# Altium footprint library PcbLib1.PcbLib: 148 footprints (part 9 of 10)
Each footprint in its own frame and in the unit in brackets; x right, y up, seen from the top. Pads: shape width x height; smd on the part's side, far side on the other; paste and mask are expansions set on the pad; w line width, h text height; cw(c..) or ccw(c..) is an arc to the next point about the centre after c.
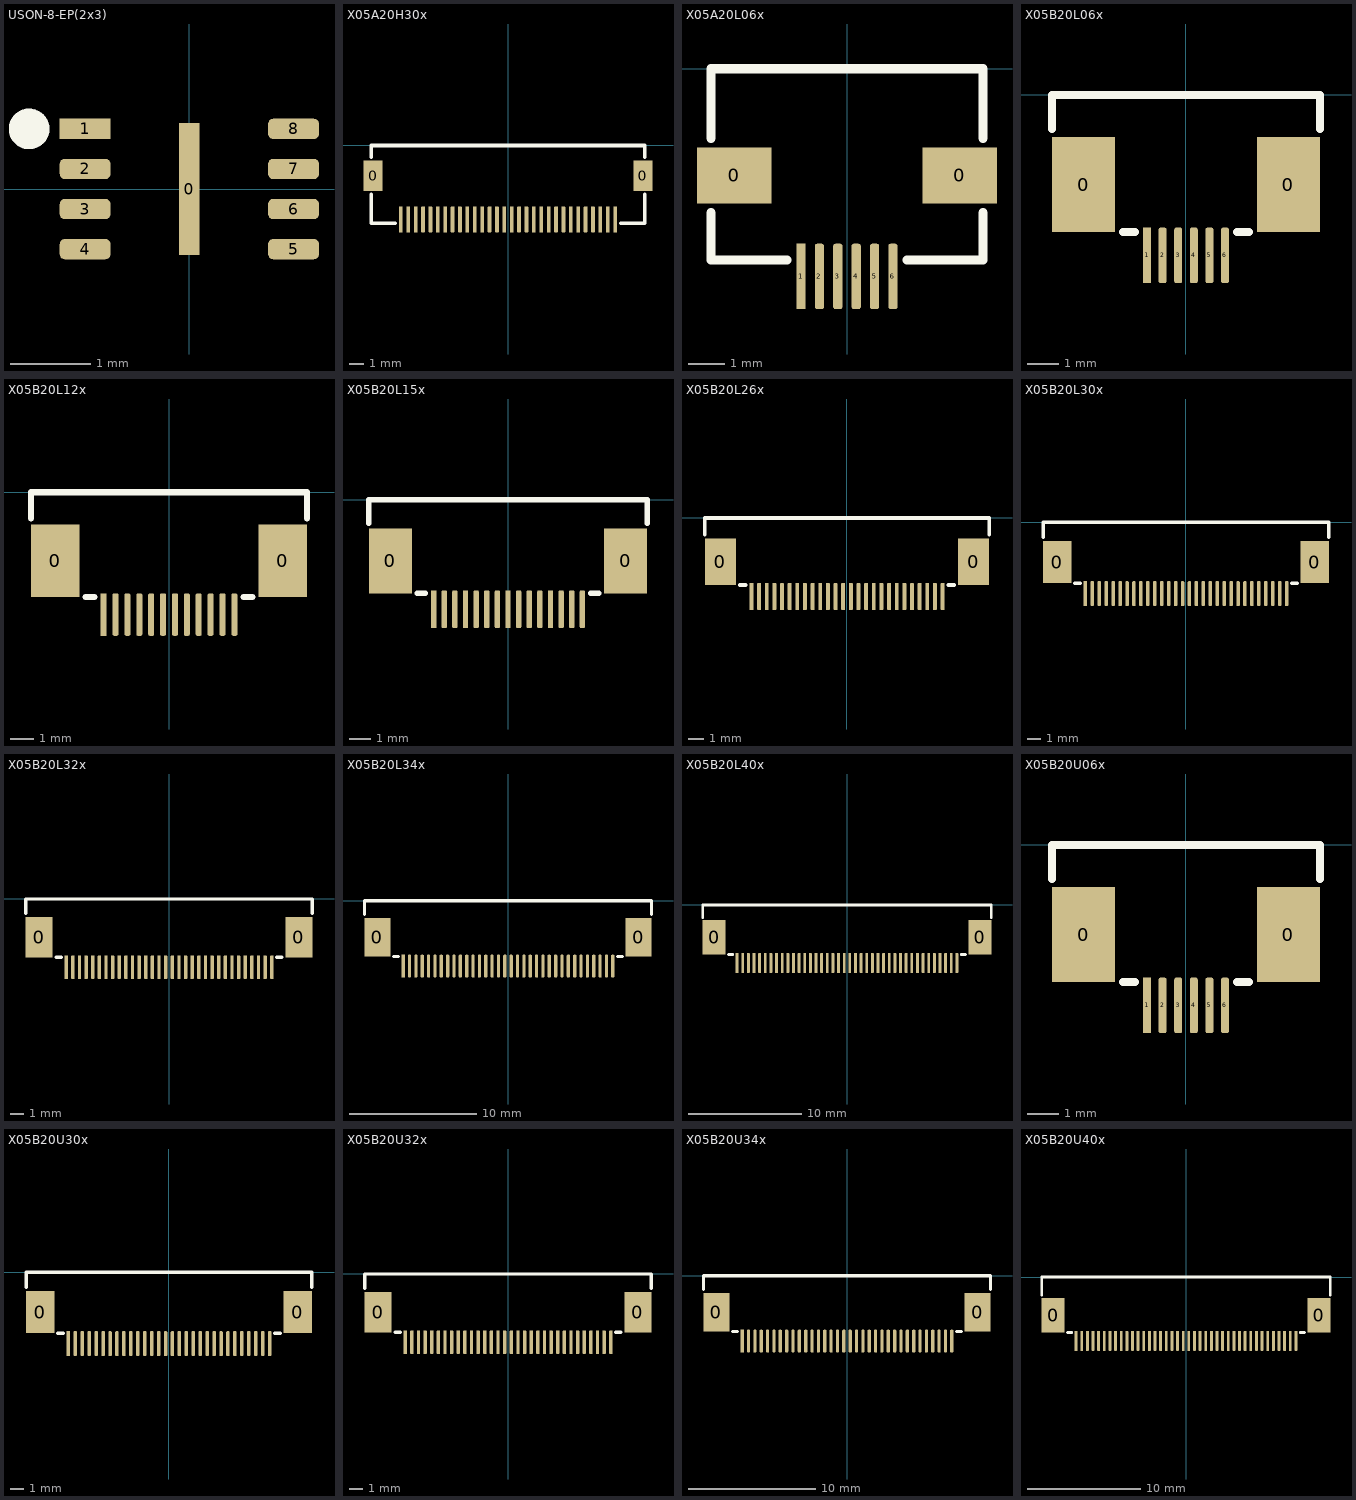
[diagram p8: the footprints below, top view; thin cyan lines are the x and y axes]

## USON-8-EP(2x3) [mm]
pads (9):
  rect 0.254x1.651 smd: 0(0,0)
  rect 0.635x0.254 smd: 1(-1.3,0.75)
  rrect50% 0.635x0.254 smd: 2(-1.3,0.25) 3(-1.3,-0.25) 4(-1.3,-0.75) 5(1.3,-0.75) 6(1.3,-0.25) 7(1.3,0.25) 8(1.3,0.75)
Top Overlay:
  circle w0.254: c-1.998,0.75 r0.127
3D body "USON-8-EP(2x3).step": height 0.51, standoff 0, extent -1.549,-1.054 1.549,1.054

## X05A20H30x [mil] "XKB，0.5mm(H=2.0mm)，30P，翻盖式，双侧触点/上下接，T:镀锡 G:镀锡"
pads (32):
  rect 50x80 smd: 0(-359.61,-80.71) 0(359.61,-80.71)
  rect 10x70 smd: 1(-285.43,-197.09)
  rrect50% 10x70 smd: 2(-265.75,-197.09) 3(-246.06,-197.09) 4(-226.38,-197.09) 5(-206.69,-197.09) 6(-187.01,-197.09) 7(-167.32,-197.09) 8(-147.64,-197.09) 9(-127.95,-197.09) 10(-108.27,-197.09) 11(-88.58,-197.09) 12(-68.9,-197.09) 13(-49.21,-197.09) 14(-29.53,-197.09) 15(-9.84,-197.09) 16(9.84,-197.09) 17(29.53,-197.09) 18(49.21,-197.09) 19(68.9,-197.09) 20(88.58,-197.09) 21(108.27,-197.09) 22(127.95,-197.09) 23(147.64,-197.09) 24(167.32,-197.09) 25(187.01,-197.09) 26(206.69,-197.09) 27(226.38,-197.09) 28(246.06,-197.09) 29(265.75,-197.09) 30(285.43,-197.09)
Top Overlay:
  lines w10: -364.17,-130.71 -364.17,-207.09 -300.43,-207.09 ; -364.17,-30.71 -364.17,0 364.17,0 364.17,-30.71 ; 300.43,-207.09 364.17,-207.09 364.17,-130.71
3D body "X05A20H30T.stp": height 78.74, standoff 0, extent -364.17,-232.28 364.17,0

## X05A20L06x [mil] "XKB，0.5mm(H=2.0mm)，6P，翻盖式，下接，T:镀锡 G:镀锡"
pads (8):
  rect 80x60 smd: 0(-120.67,-114.17) 0(120.67,-114.17)
  rect 10x70 smd: 1(-49.21,-222.28)
  rrect50% 10x70 smd: 2(-29.53,-222.28) 3(-9.84,-222.28) 4(9.84,-222.28) 5(29.53,-222.28) 6(49.21,-222.28)
Top Overlay:
  lines w10: -145.67,-154.17 -145.67,-204.72 -64.21,-204.72 ; -145.67,-74.17 -145.67,0 145.67,0 145.67,-74.17 ; 64.21,-204.72 145.67,-204.72 145.67,-154.17
3D body "X05A20L06T.stp": height 78.74, standoff 0, extent -145.67,-232.28 145.67,0

## X05B20L06x [mil] "XKB，0.5mm(H=2.0mm)，6P，抽屉式，下接，T:镀锡 G:镀锡"
pads (8):
  rect 80x120 smd: 0(-129.29,-113.23) 0(129.29,-113.23)
  rect 10x70 smd: 1(-49.21,-202.6)
  rrect50% 10x70 smd: 2(-29.53,-202.6) 3(-9.84,-202.6) 4(9.84,-202.6) 5(29.53,-202.6) 6(49.21,-202.6)
Top Overlay:
  lines w10: -169.29,-43.23 -169.29,0 169.29,0 169.29,-43.23 ; -79.29,-173.23 -64.21,-173.23 ; 64.21,-173.23 79.29,-173.23
3D body "X05B20L06T.stp": height 78.74, standoff 0, extent -169.29,-208.66 169.29,0

## X05B20L12x [mil] "XKB，0.5mm(H=2.0mm)，6P，抽屉式，下接，T:镀锡 G:镀锡"
pads (14):
  rect 80x120 smd: 0(-188.35,-113.23) 0(188.35,-113.23)
  rect 10x70 smd: 1(-108.27,-202.6)
  rrect50% 10x70 smd: 2(-88.58,-202.6) 3(-68.9,-202.6) 4(-49.21,-202.6) 5(-29.53,-202.6) 6(-9.84,-202.6) 7(9.84,-202.6) 8(29.53,-202.6) 9(49.21,-202.6) 10(68.9,-202.6) 11(88.58,-202.6) 12(108.27,-202.6)
Top Overlay:
  lines w10: -228.35,-43.23 -228.35,0 228.35,0 228.35,-43.23 ; -138.35,-173.23 -123.27,-173.23 ; 123.27,-173.23 138.35,-173.23

## X05B20L15x [mil] "XKB，0.5mm(H=2.0mm)，6P，抽屉式，下接，T:镀锡 G:镀锡"
pads (17):
  rect 80x120 smd: 0(-217.87,-113.23) 0(217.87,-113.23)
  rect 10x70 smd: 1(-137.79,-202.6)
  rrect50% 10x70 smd: 2(-118.11,-202.6) 3(-98.42,-202.6) 4(-78.74,-202.6) 5(-59.05,-202.6) 6(-39.37,-202.6) 7(-19.68,-202.6) 8(0,-202.6) 9(19.68,-202.6) 10(39.37,-202.6) 11(59.05,-202.6) 12(78.74,-202.6) 13(98.42,-202.6) 14(118.11,-202.6) 15(137.79,-202.6)
Top Overlay:
  lines w10: -257.87,-43.23 -257.87,0 257.87,0 257.87,-43.23 ; -167.87,-173.23 -152.79,-173.23 ; 152.79,-173.23 167.87,-173.23

## X05B20L26x [mil] "XKB，0.5mm(H=2.0mm)，26P，抽屉式，下接，T:镀锡 G:镀锡"
pads (28):
  rect 80x120 smd: 0(-326.14,-113.23) 0(326.14,-113.23)
  rect 10x70 smd: 1(-246.06,-202.6)
  rrect50% 10x70 smd: 2(-226.38,-202.6) 3(-206.69,-202.6) 4(-187.01,-202.6) 5(-167.32,-202.6) 6(-147.64,-202.6) 7(-127.95,-202.6) 8(-108.27,-202.6) 9(-88.58,-202.6) 10(-68.9,-202.6) 11(-49.21,-202.6) 12(-29.53,-202.6) 13(-9.84,-202.6) 14(9.84,-202.6) 15(29.53,-202.6) 16(49.21,-202.6) 17(68.9,-202.6) 18(88.58,-202.6) 19(108.27,-202.6) 20(127.95,-202.6) 21(147.64,-202.6) 22(167.32,-202.6) 23(187.01,-202.6) 24(206.69,-202.6) 25(226.38,-202.6) 26(246.06,-202.6)
Top Overlay:
  lines w10: -366.14,-43.23 -366.14,0 366.14,0 366.14,-43.23 ; -276.14,-173.23 -261.06,-173.23 ; 261.06,-173.23 276.14,-173.23

## X05B20L30x [mil] "XKB，0.5mm(H=2.0mm)，30P，抽屉式，下接，T:镀锡 G:镀锡"
pads (32):
  rect 80x120 smd: 0(-365.51,-113.23) 0(365.51,-113.23)
  rect 10x70 smd: 1(-285.43,-202.6)
  rrect50% 10x70 smd: 2(-265.75,-202.6) 3(-246.06,-202.6) 4(-226.38,-202.6) 5(-206.69,-202.6) 6(-187.01,-202.6) 7(-167.32,-202.6) 8(-147.64,-202.6) 9(-127.95,-202.6) 10(-108.27,-202.6) 11(-88.58,-202.6) 12(-68.9,-202.6) 13(-49.21,-202.6) 14(-29.53,-202.6) 15(-9.84,-202.6) 16(9.84,-202.6) 17(29.53,-202.6) 18(49.21,-202.6) 19(68.9,-202.6) 20(88.58,-202.6) 21(108.27,-202.6) 22(127.95,-202.6) 23(147.64,-202.6) 24(167.32,-202.6) 25(187.01,-202.6) 26(206.69,-202.6) 27(226.38,-202.6) 28(246.06,-202.6) 29(265.75,-202.6) 30(285.43,-202.6)
Top Overlay:
  lines w10: -405.51,-43.23 -405.51,0 405.51,0 405.51,-43.23 ; -315.51,-173.23 -300.43,-173.23 ; 300.43,-173.23 315.51,-173.23
3D body "X05B20L30T.stp": height 78.74, standoff 0, extent -405.51,-208.66 405.51,0

## X05B20L32x [mil] "XKB，0.5mm(H=2.0mm)，32P，抽屉式，下接，T:镀锡 G:镀锡"
pads (34):
  rect 80x120 smd: 0(-385.2,-113.23) 0(385.2,-113.23)
  rect 10x70 smd: 1(-305.12,-202.6)
  rrect50% 10x70 smd: 2(-285.43,-202.6) 3(-265.75,-202.6) 4(-246.06,-202.6) 5(-226.38,-202.6) 6(-206.69,-202.6) 7(-187.01,-202.6) 8(-167.32,-202.6) 9(-147.64,-202.6) 10(-127.95,-202.6) 11(-108.27,-202.6) 12(-88.58,-202.6) 13(-68.9,-202.6) 14(-49.21,-202.6) 15(-29.53,-202.6) 16(-9.84,-202.6) 17(9.84,-202.6) 18(29.53,-202.6) 19(49.21,-202.6) 20(68.9,-202.6) 21(88.58,-202.6) 22(108.27,-202.6) 23(127.95,-202.6) 24(147.64,-202.6) 25(167.32,-202.6) 26(187.01,-202.6) 27(206.69,-202.6) 28(226.38,-202.6) 29(246.06,-202.6) 30(265.75,-202.6) 31(285.43,-202.6) 32(305.12,-202.6)
Top Overlay:
  lines w10: -425.2,-43.23 -425.2,0 425.2,0 425.2,-43.23 ; -335.2,-173.23 -320.12,-173.23 ; 320.12,-173.23 335.2,-173.23
3D body "X05B20L32T.stp": height 78.74, standoff 0, extent -425.2,-208.66 425.2,0

## X05B20L34x [mil] "XKB，0.5mm(H=2.0mm)，34P，抽屉式，下接，T:镀锡 G:镀锡"
pads (36):
  rect 80x120 smd: 0(-404.88,-113.23) 0(404.88,-113.23)
  rect 10x70 smd: 1(-324.8,-202.6)
  rrect50% 10x70 smd: 2(-305.12,-202.6) 3(-285.43,-202.6) 4(-265.75,-202.6) 5(-246.06,-202.6) 6(-226.38,-202.6) 7(-206.69,-202.6) 8(-187.01,-202.6) 9(-167.32,-202.6) 10(-147.64,-202.6) 11(-127.95,-202.6) 12(-108.27,-202.6) 13(-88.58,-202.6) 14(-68.9,-202.6) 15(-49.21,-202.6) 16(-29.53,-202.6) 17(-9.84,-202.6) 18(9.84,-202.6) 19(29.53,-202.6) 20(49.21,-202.6) 21(68.9,-202.6) 22(88.58,-202.6) 23(108.27,-202.6) 24(127.95,-202.6) 25(147.64,-202.6) 26(167.32,-202.6) 27(187.01,-202.6) 28(206.69,-202.6) 29(226.38,-202.6) 30(246.06,-202.6) 31(265.75,-202.6) 32(285.43,-202.6) 33(305.12,-202.6) 34(324.8,-202.6)
Top Overlay:
  lines w10: -444.88,-43.23 -444.88,0 444.88,0 444.88,-43.23 ; -354.88,-173.23 -339.8,-173.23 ; 339.8,-173.23 354.88,-173.23
3D body "X05B20L34T.stp": height 78.74, standoff 0, extent -444.88,-208.66 444.88,0

## X05B20L40x [mil] "XKB，0.5mm(H=2.0mm)，40P，抽屉式，下接，T:镀锡 G:镀锡"
pads (42):
  rect 80x120 smd: 0(-463.94,-113.23) 0(463.94,-113.23)
  rect 10x70 smd: 1(-383.86,-202.6)
  rrect50% 10x70 smd: 2(-364.17,-202.6) 3(-344.49,-202.6) 4(-324.8,-202.6) 5(-305.12,-202.6) 6(-285.43,-202.6) 7(-265.75,-202.6) 8(-246.06,-202.6) 9(-226.38,-202.6) 10(-206.69,-202.6) 11(-187.01,-202.6) 12(-167.32,-202.6) 13(-147.64,-202.6) 14(-127.95,-202.6) 15(-108.27,-202.6) 16(-88.58,-202.6) 17(-68.9,-202.6) 18(-49.21,-202.6) 19(-29.53,-202.6) 20(-9.84,-202.6) 21(9.84,-202.6) 22(29.53,-202.6) 23(49.21,-202.6) 24(68.9,-202.6) 25(88.58,-202.6) 26(108.27,-202.6) 27(127.95,-202.6) 28(147.64,-202.6) 29(167.32,-202.6) 30(187.01,-202.6) 31(206.69,-202.6) 32(226.38,-202.6) 33(246.06,-202.6) 34(265.75,-202.6) 35(285.43,-202.6) 36(305.12,-202.6) 37(324.8,-202.6) 38(344.49,-202.6) 39(364.17,-202.6) 40(383.86,-202.6)
Top Overlay:
  lines w10: -503.94,-43.23 -503.94,0 503.94,0 503.94,-43.23 ; -413.94,-173.23 -398.86,-173.23 ; 398.86,-173.23 413.94,-173.23
3D body "X05B20L40T.stp": height 78.74, standoff 0, extent -503.94,-208.66 503.94,0

## X05B20U06x [mil] "XKB，0.5mm(H=2.0mm)，6P，抽屉式，上接，T:镀锡 G:镀锡"
pads (8):
  rect 80x120 smd: 0(-129.29,-113.23) 0(129.29,-113.23)
  rect 10x70 smd: 1(-49.21,-202.6)
  rrect50% 10x70 smd: 2(-29.53,-202.6) 3(-9.84,-202.6) 4(9.84,-202.6) 5(29.53,-202.6) 6(49.21,-202.6)
Top Overlay:
  lines w10: -169.29,-43.23 -169.29,0 169.29,0 169.29,-43.23 ; -79.29,-173.23 -64.21,-173.23 ; 64.21,-173.23 79.29,-173.23
3D body "X05B20U06T.stp": height 78.74, standoff 0, extent -169.29,-204.72 169.29,0

## X05B20U30x [mil] "XKB，0.5mm(H=2.0mm)，30P，抽屉式，上接，T:镀锡 G:镀锡"
pads (32):
  rect 80x120 smd: 0(-365.51,-113.23) 0(365.51,-113.23)
  rect 10x70 smd: 1(-285.43,-202.6)
  rrect50% 10x70 smd: 2(-265.75,-202.6) 3(-246.06,-202.6) 4(-226.38,-202.6) 5(-206.69,-202.6) 6(-187.01,-202.6) 7(-167.32,-202.6) 8(-147.64,-202.6) 9(-127.95,-202.6) 10(-108.27,-202.6) 11(-88.58,-202.6) 12(-68.9,-202.6) 13(-49.21,-202.6) 14(-29.53,-202.6) 15(-9.84,-202.6) 16(9.84,-202.6) 17(29.53,-202.6) 18(49.21,-202.6) 19(68.9,-202.6) 20(88.58,-202.6) 21(108.27,-202.6) 22(127.95,-202.6) 23(147.64,-202.6) 24(167.32,-202.6) 25(187.01,-202.6) 26(206.69,-202.6) 27(226.38,-202.6) 28(246.06,-202.6) 29(265.75,-202.6) 30(285.43,-202.6)
Top Overlay:
  lines w10: -405.51,-43.23 -405.51,0 405.51,0 405.51,-43.23 ; -315.51,-173.23 -300.43,-173.23 ; 300.43,-173.23 315.51,-173.23
3D body "X05B20U30T.stp": height 78.74, standoff 0, extent -405.51,-204.72 405.51,0

## X05B20U32x [mil] "XKB，0.5mm(H=2.0mm)，32P，抽屉式，上接，T:镀锡 G:镀锡"
pads (34):
  rect 80x120 smd: 0(-385.2,-113.23) 0(385.2,-113.23)
  rect 10x70 smd: 1(-305.12,-202.6)
  rrect50% 10x70 smd: 2(-285.43,-202.6) 3(-265.75,-202.6) 4(-246.06,-202.6) 5(-226.38,-202.6) 6(-206.69,-202.6) 7(-187.01,-202.6) 8(-167.32,-202.6) 9(-147.64,-202.6) 10(-127.95,-202.6) 11(-108.27,-202.6) 12(-88.58,-202.6) 13(-68.9,-202.6) 14(-49.21,-202.6) 15(-29.53,-202.6) 16(-9.84,-202.6) 17(9.84,-202.6) 18(29.53,-202.6) 19(49.21,-202.6) 20(68.9,-202.6) 21(88.58,-202.6) 22(108.27,-202.6) 23(127.95,-202.6) 24(147.64,-202.6) 25(167.32,-202.6) 26(187.01,-202.6) 27(206.69,-202.6) 28(226.38,-202.6) 29(246.06,-202.6) 30(265.75,-202.6) 31(285.43,-202.6) 32(305.12,-202.6)
Top Overlay:
  lines w10: -425.2,-43.23 -425.2,0 425.2,0 425.2,-43.23 ; -335.2,-173.23 -320.12,-173.23 ; 320.12,-173.23 335.2,-173.23
3D body "X05B20U32T.stp": height 78.74, standoff 0, extent -425.2,-204.72 425.2,0

## X05B20U34x [mil] "XKB，0.5mm(H=2.0mm)，34P，抽屉式，上接，T:镀锡 G:镀锡"
pads (36):
  rect 80x120 smd: 0(-404.88,-113.23) 0(404.88,-113.23)
  rect 10x70 smd: 1(-324.8,-202.6)
  rrect50% 10x70 smd: 2(-305.12,-202.6) 3(-285.43,-202.6) 4(-265.75,-202.6) 5(-246.06,-202.6) 6(-226.38,-202.6) 7(-206.69,-202.6) 8(-187.01,-202.6) 9(-167.32,-202.6) 10(-147.64,-202.6) 11(-127.95,-202.6) 12(-108.27,-202.6) 13(-88.58,-202.6) 14(-68.9,-202.6) 15(-49.21,-202.6) 16(-29.53,-202.6) 17(-9.84,-202.6) 18(9.84,-202.6) 19(29.53,-202.6) 20(49.21,-202.6) 21(68.9,-202.6) 22(88.58,-202.6) 23(108.27,-202.6) 24(127.95,-202.6) 25(147.64,-202.6) 26(167.32,-202.6) 27(187.01,-202.6) 28(206.69,-202.6) 29(226.38,-202.6) 30(246.06,-202.6) 31(265.75,-202.6) 31(305.12,-202.6) 32(285.43,-202.6) 32(324.8,-202.6)
Top Overlay:
  lines w10: -444.88,-43.23 -444.88,0 444.88,0 444.88,-43.23 ; -354.88,-173.23 -339.8,-173.23 ; 339.8,-173.23 354.88,-173.23
3D body "X05B20U34T.stp": height 78.74, standoff 0, extent -444.88,-204.72 444.88,0

## X05B20U40x [mil] "XKB，0.5mm(H=2.0mm)，40P，抽屉式，上接，T:镀锡 G:镀锡"
pads (42):
  rect 80x120 smd: 0(-463.94,-132.91) 0(463.94,-132.91)
  rect 10x70 smd: 1(-383.86,-222.28)
  rrect50% 10x70 smd: 2(-364.17,-222.28) 3(-344.49,-222.28) 4(-324.8,-222.28) 5(-305.12,-222.28) 6(-285.43,-222.28) 7(-265.75,-222.28) 8(-246.06,-222.28) 9(-226.38,-222.28) 10(-206.69,-222.28) 11(-187.01,-222.28) 12(-167.32,-222.28) 13(-147.64,-222.28) 14(-127.95,-222.28) 15(-108.27,-222.28) 16(-88.58,-222.28) 17(-68.9,-222.28) 18(-49.21,-222.28) 19(-29.53,-222.28) 20(-9.84,-222.28) 21(9.84,-222.28) 22(29.53,-222.28) 23(49.21,-222.28) 24(68.9,-222.28) 25(88.58,-222.28) 26(108.27,-222.28) 27(127.95,-222.28) 28(147.64,-222.28) 29(167.32,-222.28) 30(187.01,-222.28) 31(206.69,-222.28) 32(226.38,-222.28) 33(246.06,-222.28) 34(265.75,-222.28) 35(285.43,-222.28) 36(305.12,-222.28) 37(324.8,-222.28) 38(344.49,-222.28) 39(364.17,-222.28) 40(383.86,-222.28)
Top Overlay:
  lines w10: -503.94,-62.91 -503.94,0 503.94,0 503.94,-62.91 ; -413.94,-192.91 -398.86,-192.91 ; 398.86,-192.91 413.94,-192.91
3D body "X05B20U40T.stp": height 78.74, standoff 0, extent -503.94,-235.04 503.94,0